# Altium footprint library 3M THD.PcbLib: 163 footprints (part 14 of 14)
Each footprint in its own frame and in the unit in brackets; x right, y up, seen from the top. Pads: shape width x height; smd on the part's side, far side on the other; paste and mask are expansions set on the pad; w line width, h text height; cw(c..) or ccw(c..) is an arc to the next point about the centre after c.
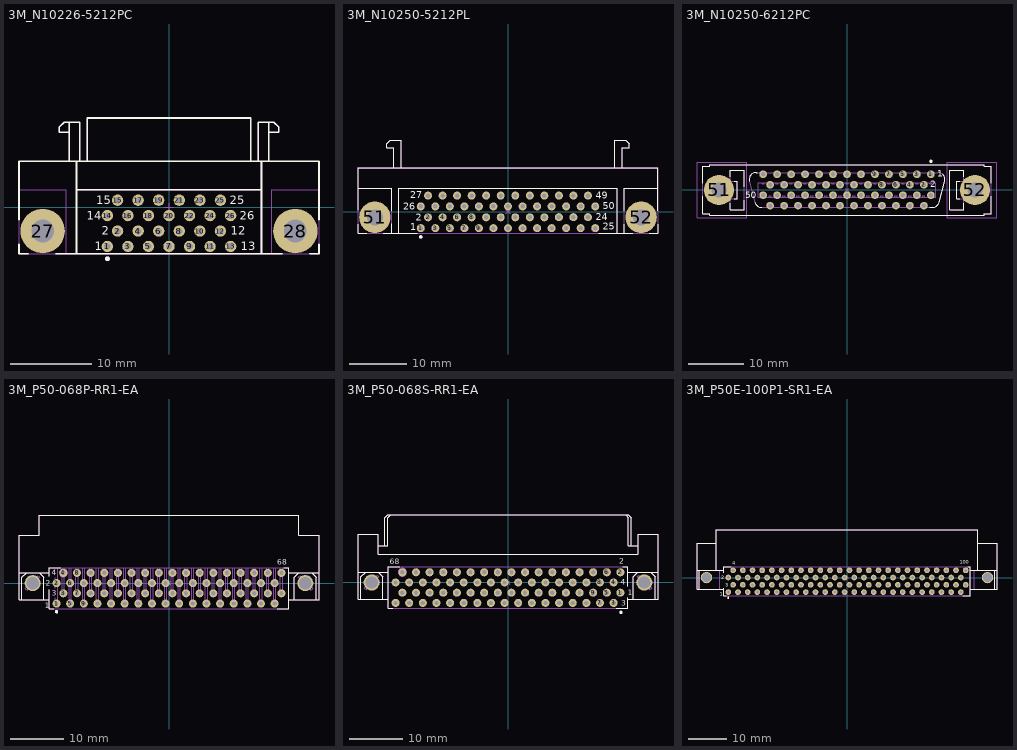
[diagram p13: the footprints below, top view; thin cyan lines are the x and y axes]

## 3M_N10226-5212PC [mm] "26 contacts, Mini D Ribbon (MDR), 102 Series, .050\" Boardmount Through-hole Right Angle Receptacle-Shielded"
height 9.4
pads (28):
  round 1.4 hole 0.8: 1(-7.62,-4.826) 2(-6.35,-2.921) 3(-5.08,-4.826) 4(-3.81,-2.921) 5(-2.54,-4.826) 6(-1.27,-2.921) 7(0,-4.826) 8(1.27,-2.921) 9(2.54,-4.826) 10(3.81,-2.921) 11(5.08,-4.826) 12(6.35,-2.921) 13(7.62,-4.826) 14(-7.62,-1.016) 15(-6.35,0.889) 16(-5.08,-1.016) 17(-3.81,0.889) 18(-2.54,-1.016) 19(-1.27,0.889) 20(0,-1.016) 21(1.27,0.889) 22(2.54,-1.016) 23(3.81,0.889) 24(5.08,-1.016) 25(6.35,0.889) 26(7.62,-1.016)
  round 5.5 hole 2.8: 27(-15.621,-2.921) 28(15.621,-2.921)
Top Overlay:
  circle w0.3: c-7.62,-6.35 r0.15
  lines w0.2: -18.542,-4.578 -18.542,-5.715 -17.405,-5.715 ; -18.542,-1.5 -18.542,5.715 18.542,5.715 18.542,-1.5 ; -14,-5.715 14,-5.715 ; -12.319,5.715 -12.319,10.541 ; -12.319,9.271 -13.589,9.271 -13.589,9.906 -12.954,10.541 -12.319,10.541 ; -11.43,-5.715 -11.43,5.715 ; -11.43,2.159 11.43,2.159 ; -11.049,5.715 -11.049,10.541 -12.319,10.541 ; -10.1,5.715 -10.1,11.049 10.1,11.049 10.1,5.715 ; 11.049,5.715 11.049,10.541 12.319,10.541 ; 11.43,-5.715 11.43,5.715 ; 12.319,5.715 12.319,10.541 ; 12.319,9.271 13.589,9.271 13.589,9.906 12.954,10.541 12.319,10.541 ; 17.405,-5.715 18.542,-5.715 18.542,-4.578
  text "1" at -9.19,-5.31 h1.02
  text "2" at -8.32,-3.405 h1.02
  text "15" at -9.02,0.405 h1.02
  text "14" at -10.14,-1.5 h1.02
  text "26" at 8.77,-1.505 h1.02
  text "13" at 8.895,-5.315 h1.02
  text "12" at 7.615,-3.41 h1.02
  text "25" at 7.49,0.4 h1.02
Mechanical 8:
  lines w0.1: -8.12,-4.826 -7.62,-4.826 ; -8.12,-1.016 -7.62,-1.016 ; -7.62,-5.326 -7.62,-4.826 ; -7.62,-4.326 -7.62,-4.826 ; -7.12,-4.826 -7.62,-4.826 ; -7.12,-1.016 -7.62,-1.016 ; -6.85,-2.921 -6.35,-2.921 ; -6.85,0.889 -6.35,0.889 ; -6.35,-3.421 -6.35,-2.921 ; -6.35,-2.421 -6.35,-2.921 ; -6.35,0.389 -6.35,0.889 ; -6.35,1.389 -6.35,0.889 ; -5.85,-2.921 -6.35,-2.921 ; -5.85,0.889 -6.35,0.889 ; -5.58,-4.826 -5.08,-4.826 ; -5.58,-1.016 -5.08,-1.016 ; -5.08,-5.326 -5.08,-4.826 ; -5.08,-4.326 -5.08,-4.826 ; -4.58,-4.826 -5.08,-4.826 ; -4.58,-1.016 -5.08,-1.016 ; -4.31,-2.921 -3.81,-2.921 ; -4.31,0.889 -3.81,0.889 ; -3.81,-3.421 -3.81,-2.921 ; -3.81,-2.421 -3.81,-2.921 ; -3.81,0.389 -3.81,0.889 ; -3.81,1.389 -3.81,0.889 ; -3.31,-2.921 -3.81,-2.921 ; -3.31,0.889 -3.81,0.889 ; -3.04,-4.826 -2.54,-4.826 ; -3.04,-1.016 -2.54,-1.016 ; -2.54,-5.326 -2.54,-4.826 ; -2.54,-4.326 -2.54,-4.826 ; -2.04,-4.826 -2.54,-4.826 ; -2.04,-1.016 -2.54,-1.016 ; -1.77,-2.921 -1.27,-2.921 ; -1.77,0.889 -1.27,0.889 ; -1.27,-3.421 -1.27,-2.921 ; -1.27,-2.421 -1.27,-2.921 ; -1.27,0.389 -1.27,0.889 ; -1.27,1.389 -1.27,0.889 ; -0.77,-2.921 -1.27,-2.921 ; -0.77,0.889 -1.27,0.889 ; -0.5,-4.826 0,-4.826 ; -0.5,-1.016 0,-1.016 ; -0.5,0 0,0 ; 0,-5.326 0,-4.826 ; 0,-4.326 0,-4.826 ; 0.5,-4.826 0,-4.826 ; 0.5,-1.016 0,-1.016 ; 0.5,0 0,0 ; 0.77,-2.921 1.27,-2.921 ; 0.77,0.889 1.27,0.889 ; 1.27,-3.421 1.27,-2.921 ; 1.27,-2.421 1.27,-2.921 ; 1.27,0.389 1.27,0.889 ; 1.27,1.389 1.27,0.889 ; 1.77,-2.921 1.27,-2.921 ; 1.77,0.889 1.27,0.889 ; 2.04,-4.826 2.54,-4.826 ; 2.04,-1.016 2.54,-1.016 ; 2.54,-5.326 2.54,-4.826 ; 2.54,-4.326 2.54,-4.826 ; 3.04,-4.826 2.54,-4.826 ; 3.04,-1.016 2.54,-1.016 ; 3.31,-2.921 3.81,-2.921 ; 3.31,0.889 3.81,0.889 ; 3.81,-3.421 3.81,-2.921 ; 3.81,-2.421 3.81,-2.921 ; 3.81,0.389 3.81,0.889 ; 3.81,1.389 3.81,0.889 ; 4.31,-2.921 3.81,-2.921 ; 4.31,0.889 3.81,0.889 ; 4.58,-4.826 5.08,-4.826 ; 4.58,-1.016 5.08,-1.016 ; 5.08,-5.326 5.08,-4.826 ; 5.08,-4.326 5.08,-4.826 ; 5.58,-4.826 5.08,-4.826 ; 5.58,-1.016 5.08,-1.016 ; 5.85,-2.921 6.35,-2.921 ; 5.85,0.889 6.35,0.889 ; 6.35,-3.421 6.35,-2.921 ; 6.35,-2.421 6.35,-2.921 ; 6.35,0.389 6.35,0.889 ; 6.35,1.389 6.35,0.889 ; 6.85,-2.921 6.35,-2.921 ; 6.85,0.889 6.35,0.889 ; 7.12,-4.826 7.62,-4.826 ; 7.12,-1.016 7.62,-1.016 ; 7.62,-5.326 7.62,-4.826 ; 7.62,-4.326 7.62,-4.826 ; 8.12,-4.826 7.62,-4.826 ; 8.12,-1.016 7.62,-1.016 ; 15.121,-2.921 15.621,-2.921 ; 15.621,-3.421 15.621,-2.921 ; 15.621,-2.421 15.621,-2.921 ; 16.121,-2.921 15.621,-2.921 ; -7.62,-1.016 -7.62,-1.516 -7.62,-1.016 ; -7.62,-1.016 -7.62,-0.516 -7.62,-1.016 ; -5.08,-1.016 -5.08,-1.516 -5.08,-1.016 ; -5.08,-1.016 -5.08,-0.516 -5.08,-1.016 ; -2.54,-1.016 -2.54,-1.516 -2.54,-1.016 ; -2.54,-1.016 -2.54,-0.516 -2.54,-1.016 ; 0,-1.016 0,-1.516 0,-1.016 ; 0,-1.016 0,-0.516 0,-1.016 ; 0,0 0,-0.5 0,0 ; 0,0 0,0.5 0,0 ; 2.54,-1.016 2.54,-1.516 2.54,-1.016 ; 2.54,-1.016 2.54,-0.516 2.54,-1.016 ; 5.08,-1.016 5.08,-1.516 5.08,-1.016 ; 5.08,-1.016 5.08,-0.516 5.08,-1.016 ; 7.62,-1.016 7.62,-1.516 7.62,-1.016 ; 7.62,-1.016 7.62,-0.516 7.62,-1.016
  lines w0.2: -16.121,-2.921 -15.621,-2.921 ; -15.621,-3.421 -15.621,-2.921 ; -15.621,-2.421 -15.621,-2.921 ; -15.121,-2.921 -15.621,-2.921
Mechanical 14:
  circle w0.1: c-15.621,-2.921 r1.245
  circle w0.1: c15.621,-2.921 r1.245
  circle w0.1: c15.621,-2.921 r1.245
  circle w0.3: c-7.62,-6.35 r0.15
  lines w0.1: -18.542,2.159 -12.7,2.159 -12.7,-5.715 ; -15.875,-4.139 -15.875,-5.099 -15.367,-5.099 -15.367,-4.139 ; -15.875,-1.703 -15.875,-0.743 -15.367,-0.743 -15.367,-1.703 ; -12.319,5.715 -12.319,10.541 ; -12.319,9.271 -13.589,9.271 -13.589,9.906 -12.954,10.541 -12.319,10.541 ; -11.43,-5.715 -11.43,5.715 ; -11.43,2.159 11.43,2.159 ; -11.049,5.715 -11.049,10.541 -12.319,10.541 ; -10.1,5.715 -10.1,11.049 10.1,11.049 10.1,5.715 ; 11.049,5.715 11.049,10.541 12.319,10.541 ; 11.43,-5.715 11.43,5.715 ; 12.319,5.715 12.319,10.541 ; 12.319,9.271 13.589,9.271 13.589,9.906 12.954,10.541 12.319,10.541 ; 12.7,-5.715 12.7,2.159 18.542,2.159 ; 15.367,-4.139 15.367,-5.099 15.875,-5.099 15.875,-4.139 ; 15.367,-1.703 15.367,-0.743 15.875,-0.743 15.875,-1.703 ; -18.542,-5.715 18.542,-5.715 18.542,5.715 -18.542,5.715 -18.542,-5.715
  text "1" at -9.19,-5.31 h1.02
  text "2" at -8.32,-3.405 h1.02
  text "15" at -9.02,0.405 h1.02
  text "14" at -10.14,-1.5 h1.02
  text "26" at 8.77,-1.505 h1.02
  text "13" at 8.895,-5.315 h1.02
  text "12" at 7.615,-3.41 h1.02
  text "25" at 7.49,0.4 h1.02
3D body "3M_N10226-5212PC.stp": height 9.4, standoff -3.81, extent -18.542,-5.715 18.542,11.049

## 3M_N10250-5212PL [mm] "50 contacts, Mini D Ribbon (MDR), 102 Series, .050\" Boardmount Through-hole Right Angle Receptacle-Shielded"
height 9.4
pads (52):
  round 1.4 hole 0.8: 1(-15.24,-2.85) 2(-13.97,-0.945) 3(-12.7,-2.85) 4(-11.43,-0.945) 5(-10.16,-2.85) 6(-8.89,-0.945) 7(-7.62,-2.85) 8(-6.35,-0.945) 9(-5.08,-2.85) 10(-3.81,-0.945) 11(-2.54,-2.85) 12(-1.27,-0.945) 13(0,-2.85) 14(1.27,-0.945) 15(2.54,-2.85) 16(3.81,-0.945) 17(5.08,-2.85) 18(6.35,-0.945) 19(7.62,-2.85) 20(8.89,-0.936) 21(10.16,-2.85) 22(11.43,-0.936) 23(12.7,-2.85) 24(13.97,-0.936) 25(15.24,-2.85) 26(-15.24,0.95) 27(-13.97,2.85) 28(-12.7,0.95) 29(-11.43,2.85) 30(-10.16,0.95) 31(-8.89,2.85) 32(-7.62,0.95) 33(-6.35,2.85) 34(-5.08,0.95) 35(-3.81,2.85) 36(-2.54,0.95) 37(-1.27,2.85) 38(0,0.95) 39(1.27,2.85) 40(2.54,0.95) 41(3.81,2.85) 42(5.08,0.95) 43(6.35,2.85) 44(7.62,0.95) 45(8.89,2.85) 46(10.16,0.95) 47(11.43,2.85) 48(12.7,0.95) 49(13.97,2.85) 50(15.24,0.95)
  round 5.5 hole 2.8: 51(-23.25,-0.95) 52(23.25,-0.95)
Top Overlay:
  circle w0.3: c-15.24,-4.374 r0.15
  lines w0.2: -26.162,-2.173 -26.162,-3.744 -24.714,-3.744 ; -26.162,0.273 -26.162,7.686 26.162,7.686 26.162,0.229 ; -26.162,4.13 -20.32,4.13 -20.32,0.183 ; -21.804,-3.744 -15.881,-3.744 ; -20.32,-3.744 -20.32,-2.083 ; -19.939,7.65 -19.939,11.242 -21.209,11.242 -21.209,11.877 -20.574,12.512 -18.669,12.512 -18.669,7.686 ; -19.05,-3.744 -19.05,4.13 19.05,4.13 19.05,-3.744 ; 15.881,-3.744 21.786,-3.744 ; 18.669,7.686 18.669,12.512 20.574,12.512 21.209,11.877 21.209,11.242 19.939,11.242 19.939,7.686 ; 20.32,-3.744 20.32,-2.129 ; 20.32,0.229 20.32,4.13 26.162,4.13 ; 24.696,-3.744 26.162,-3.744 26.162,-2.129
  text "1" at -17.06,-3.184 h1.2
  text "2" at -16.115,-1.529 h1.2
  text "27" at -17.115,2.381 h1.2
  text "26" at -18.285,0.401 h1.2
  text "50" at 16.565,0.446 h1.2
  text "25" at 16.59,-3.139 h1.2
  text "24" at 15.31,-1.434 h1.2
  text "49" at 15.36,2.276 h1.2
Mechanical 8:
  drawing of 216 lines, arcs and shapes, not listed
Mechanical 14:
  circle w0.3: c-15.24,-4.374 r0.15
  lines w0.1: -26.162,4.13 -20.32,4.13 -20.32,-3.744 ; -19.939,7.65 -19.939,11.242 -21.209,11.242 -21.209,11.877 -20.574,12.512 -18.669,12.512 -18.669,7.686 ; -19.05,-3.744 -19.05,4.13 19.05,4.13 19.05,-3.744 ; 18.669,7.686 18.669,12.512 20.574,12.512 21.209,11.877 21.209,11.242 19.939,11.242 19.939,7.686 ; 20.32,-3.744 20.32,4.13 26.162,4.13 ; -26.162,-3.744 26.162,-3.744 26.162,7.686 -26.162,7.686 -26.162,-3.744 ; -23.495,-3.439 -23.495,-2.35 cw(c-23.241,-0.95) -23.495,0.45 -23.495,1.539 -22.987,1.539 -22.987,0.45 cw(c-23.241,-0.95) -22.987,-2.35 -22.987,-3.439 -23.495,-3.439 ; 22.987,-3.439 23.495,-3.439 23.495,-2.35 ccw(c23.241,-0.95) 23.495,0.45 23.495,1.539 22.987,1.539 22.987,0.45 ccw(c23.241,-0.95) 22.987,-2.35 22.987,-3.439
  text "1" at -17.06,-3.184 h1.2
  text "2" at -16.115,-1.529 h1.2
  text "27" at -17.115,2.381 h1.2
  text "26" at -18.285,0.401 h1.2
  text "50" at 16.565,0.446 h1.2
  text "25" at 16.59,-3.139 h1.2
  text "24" at 15.31,-1.434 h1.2
  text "49" at 15.36,2.276 h1.2
3D body "3M_N10250-5212PL.stp": height 9.4, standoff -3.81, extent -26.162,-3.744 26.162,13.02

## 3M_N10250-6212PC [mm] "50 contacts, Mini D Ribbon (MDR), .050\" Boardmount Through-hole Vertical Receptacle - Shielded"
height 11
pads (52):
  round 1.4 hole 0.8: 1(15.24,2.86) 2(13.97,0.955) 3(12.7,2.86) 4(11.43,0.955) 5(10.16,2.86) 6(8.89,0.955) 7(7.62,2.86) 8(6.35,0.955) 9(5.08,2.86) 10(3.81,0.955) 11(2.54,2.86) 12(1.27,0.955) 13(0,2.86) 14(-1.27,0.955) 15(-2.54,2.86) 16(-3.81,0.955) 17(-5.08,2.86) 18(-6.35,0.955) 19(-7.62,2.86) 20(-8.89,0.946) 21(-10.16,2.86) 22(-11.43,0.946) 23(-12.7,2.86) 24(-13.97,0.946) 25(-15.24,2.86) 26(15.24,-0.94) 27(13.97,-2.84) 28(12.7,-0.94) 29(11.43,-2.84) 30(10.16,-0.94) 31(8.89,-2.84) 32(7.62,-0.94) 33(6.35,-2.84) 34(5.08,-0.94) 35(3.81,-2.84) 36(2.54,-0.94) 37(1.27,-2.84) 38(0,-0.94) 39(-1.27,-2.84) 40(-2.54,-0.94) 41(-3.81,-2.84) 42(-5.08,-0.94) 43(-6.35,-2.84) 44(-7.62,-0.94) 45(-8.89,-2.84) 46(-10.16,-0.94) 47(-11.43,-2.84) 48(-12.7,-0.94) 49(-13.97,-2.84) 50(-15.24,-0.94)
  round 5.5 hole 2.8: 51(-23.25,0) 52(23.25,0)
Top Overlay:
  circle w0.3: c15.24,5.209 r0.15
  lines w0.2: -26.162,-1.179 -26.162,-4.318 -24.892,-4.318 -24.892,-4.572 24.892,-4.572 24.892,-4.318 26.162,-4.318 26.162,-1.179 ; -26.162,1.179 -26.162,4.318 -24.892,4.318 -24.892,4.572 24.892,4.572 24.892,4.318 26.162,4.318 26.162,1.179 ; -21.209,-2.407 -21.209,-3.556 -18.669,-3.556 -18.669,-1.881 ; -21.209,2.407 -21.209,3.556 -18.669,3.556 -18.669,0.6 ; -20.52,-1.587 -19.939,-1.587 -19.939,1.587 -20.52,1.587 ; -17.737,1.576 cw(c-16.51,1.905) -16.51,3.175 -16.294,3.175 ; -16.716,-2.234 ccw(c-15.489,-1.905) -15.489,-3.175 ; 15.022,-3.175 15.489,-3.175 ccw(c15.489,-1.905) 16.716,-2.234 17.737,1.576 ccw(c16.51,1.905) 17.326,2.878 ; 20.52,-1.587 19.939,-1.587 19.939,1.587 20.52,1.587 ; 21.209,-2.407 21.209,-3.556 18.669,-3.556 18.669,3.556 21.209,3.556 21.209,2.407
  text "50" at -18.525,-1.525 h1.2
  text "2" at 15.121,0.455 h1.2
  text "1" at 16.391,2.36 h1.2
Mechanical 8:
  drawing of 222 lines, arcs and shapes, not listed
Mechanical 14:
  drawing of 192 lines, arcs and shapes, not listed
3D body "3M_N10250-6212PC.stp": height 11.18, standoff -3.4, extent -26.162,-4.572 26.162,4.572

## 3M_P50-068P-RR1-EA [mm] "68 Contacts, 050\", Right Angle, Pak 50 Boardmount Plug With Retention Clips, P50 Series"
height 7
pads (70):
  round 1.5 hole 0.8: 1(-20.955,-3.81) 2(-20.955,0) 3(-19.685,-1.905) 4(-19.685,1.905) 5(-18.415,-3.81) 6(-18.415,0) 7(-17.145,-1.905) 8(-17.145,1.905) 9(-15.875,-3.81) 10(-15.875,0) 11(-14.605,-1.905) 12(-14.605,1.905) 13(-13.335,-3.81) 14(-13.335,0) 15(-12.065,-1.905) 16(-12.065,1.905) 17(-10.795,-3.81) 18(-10.795,0) 19(-9.525,-1.905) 20(-9.525,1.905) 21(-8.255,-3.81) 22(-8.255,0) 23(-6.985,-1.905) 24(-6.985,1.905) 25(-5.715,-3.81) 26(-5.715,0) 27(-4.445,-1.905) 28(-4.445,1.905) 29(-3.175,-3.81) 30(-3.175,0) 31(-1.905,-1.905) 32(-1.905,1.905) 33(-0.635,-3.81) 34(-0.635,0) 35(0.635,-1.905) 36(0.635,1.905) 37(1.905,-3.81) 38(1.905,0) 39(3.175,-1.905) 40(3.175,1.905) 41(4.445,-3.81) 42(4.445,0) 43(5.715,-1.905) 44(5.715,1.905) 45(6.985,-3.81) 46(6.985,0) 47(8.255,-1.905) 48(8.255,1.905) 49(9.525,-3.81) 50(9.525,0) 51(10.795,-1.905) 52(10.795,1.905) 53(12.065,-3.81) 54(12.065,0) 55(13.335,-1.905) 56(13.335,1.905) 57(14.605,-3.81) 58(14.605,0) 59(15.875,-1.905) 60(15.875,1.905) 61(17.145,-3.81) 62(17.145,0) 63(18.415,-1.905) 64(18.415,1.905) 65(19.685,-3.81) 66(19.685,0) 67(20.955,-1.905) 68(20.955,1.905)
  round 3 hole 2.3: MECH(-25.4,0) MECH(25.4,0)
Top Overlay:
  circle w0.3: c-20.955,-5.334 r0.15
  lines w0.2: -27.955,1.905 -22.355,1.905 ; -27.45,-3.095 -27.45,1.061 -26.55,1.905 ; -24.17,1.905 -23.35,1.061 -23.35,-3.095 ; -22.355,-3.095 -27.955,-3.095 -27.955,8.955 -24.155,8.955 -24.155,12.605 24.155,12.605 24.155,8.955 27.955,8.955 27.955,-3.095 22.355,-3.095 ; -22.355,-1.25 -22.355,-4.795 -21.445,-4.795 ; -22.355,1.25 -22.355,2.905 -20.143,2.905 ; 20.175,-4.795 22.355,-4.795 22.355,2.905 21.413,2.905 ; 22.355,1.905 27.955,1.905 ; 23.35,-3.095 23.35,1.061 24.17,1.905 ; 26.606,1.905 27.45,1.061 27.45,-3.095
  text "68" at 20.184,3.449 h1
  text "1" at -23.185,-4.725 h1
  text "2" at -22.937,-0.484 h1
  text "4" at -21.809,1.421 h1
  text "3" at -21.809,-2.389 h1
Mechanical 8:
  drawing of 285 lines, arcs and shapes, not listed
Mechanical 14:
  circle w0.3: c-20.955,-5.334 r0.15
  lines w0.1: -27.955,1.905 -22.355,1.905 ; -27.45,-3.095 -27.45,1.061 -26.55,1.905 ; -26.341,-0.661 cw(c-25.4,0) -24.734,0.937 ; -26.061,-0.941 ccw(c-25.4,0) -24.463,0.666 ; -24.17,1.905 -23.35,1.061 -23.35,-3.095 ; -22.355,-3.095 -27.955,-3.095 -27.955,8.955 -24.155,8.955 -24.155,12.605 24.155,12.605 24.155,8.955 27.955,8.955 27.955,-3.095 22.355,-3.095 ; -22.355,-1.25 -22.355,-4.795 22.355,-4.795 22.355,2.905 -22.355,2.905 -22.355,1.25 ; -21.155,-2.75 -21.155,-4.01 -20.755,-4.01 -20.755,2.905 ; -21.155,-1 -21.155,1 ; -19.885,2.905 -19.885,-2.105 -19.485,-2.105 -19.485,2.905 ; -18.615,2.905 -18.615,-4.01 -18.215,-4.01 -18.215,2.905 ; -17.345,2.905 -17.345,-2.105 -16.945,-2.105 -16.945,2.905 ; -16.075,2.905 -16.075,-4.01 -15.675,-4.01 -15.675,2.905 ; -14.805,2.905 -14.805,-2.105 -14.405,-2.105 -14.405,2.905 ; -13.535,2.905 -13.535,-4.01 -13.135,-4.01 -13.135,2.905 ; -12.265,2.905 -12.265,-2.105 -11.865,-2.105 -11.865,2.905 ; -10.995,2.905 -10.995,-4.01 -10.595,-4.01 -10.595,2.905 ; -9.725,2.905 -9.725,-2.105 -9.325,-2.105 -9.325,2.905 ; -8.455,2.905 -8.455,-4.01 -8.055,-4.01 -8.055,2.905 ; -7.185,2.905 -7.185,-2.105 -6.785,-2.105 -6.785,2.905 ; -5.915,2.905 -5.915,-4.01 -5.515,-4.01 -5.515,2.905 ; -4.645,2.905 -4.645,-2.105 -4.245,-2.105 -4.245,2.905 ; -3.375,2.905 -3.375,-4.01 -2.975,-4.01 -2.975,2.905 ; -2.105,2.905 -2.105,-2.105 -1.705,-2.105 -1.705,2.905 ; -0.835,2.905 -0.835,-4.01 -0.435,-4.01 -0.435,2.905 ; 0.435,2.905 0.435,-2.105 0.835,-2.105 0.835,2.905 ; 1.705,2.905 1.705,-4.01 2.105,-4.01 2.105,2.905 ; 2.975,2.905 2.975,-2.105 3.375,-2.105 3.375,2.905 ; 4.245,2.905 4.245,-4.01 4.645,-4.01 4.645,2.905 ; 5.515,2.905 5.515,-2.105 5.915,-2.105 5.915,2.905 ; 6.785,2.905 6.785,-4.01 7.185,-4.01 7.185,2.905 ; 8.055,2.905 8.055,-2.105 8.455,-2.105 8.455,2.905 ; 9.325,2.905 9.325,-4.01 9.725,-4.01 9.725,2.905 ; 10.595,2.905 10.595,-2.105 10.995,-2.105 10.995,2.905 ; 11.865,2.905 11.865,-4.01 12.265,-4.01 12.265,2.905 ; 13.135,2.905 13.135,-2.105 13.535,-2.105 13.535,2.905 ; 14.405,2.905 14.405,-4.01 14.805,-4.01 14.805,2.905 ; 15.675,2.905 15.675,-2.105 16.075,-2.105 16.075,2.905 ; 16.945,2.905 16.945,-4.01 17.345,-4.01 17.345,2.905 ; 18.215,2.905 18.215,-2.105 18.615,-2.105 18.615,2.905 ; 19.485,2.905 19.485,-4.01 19.885,-4.01 19.885,2.905 ; 20.755,2.905 20.755,-2.105 21.155,-2.105 21.155,2.905 ; 22.355,1.905 27.955,1.905 ; 23.35,-3.095 23.35,1.061 24.17,1.905 ; 24.458,0.659 ccw(c25.4,0) 26.059,-0.942 ; 24.741,0.942 cw(c25.4,0) 26.342,-0.659 ; 26.606,1.905 27.45,1.061 27.45,-3.095 ; -26.744,-1.061 -24.332,1.336 -24.064,1.068 -26.461,-1.344 -26.744,-1.061 ; 24.056,1.061 26.461,-1.344 26.744,-1.061 24.339,1.344 24.056,1.061
  text "68" at 20.184,3.449 h1
  text "1" at -23.185,-4.725 h1
  text "2" at -22.937,-0.484 h1
  text "4" at -21.809,1.421 h1
  text "3" at -21.809,-2.389 h1
3D body "3M_P50-068P-RR1-EA.stp": height 7, standoff -3, extent -27.955,-4.795 27.955,12.605

## 3M_P50-068S-RR1-EA [mm] "68 Contacts, 050\", Right Angle, Pak 50 Boardmount Socket With Retention Clips, P50 Series"
height 7
pads (70):
  round 1.5 hole 0.8: 1(20.955,-1.905) 2(20.955,1.905) 3(19.685,-3.81) 4(19.685,0) 5(18.415,-1.905) 6(18.415,1.905) 7(17.145,-3.81) 8(17.145,0) 9(15.875,-1.905) 10(15.875,1.905) 11(14.605,-3.81) 12(14.605,0) 13(13.335,-1.905) 14(13.335,1.905) 15(12.065,-3.81) 16(12.065,0) 17(10.795,-1.905) 18(10.795,1.905) 19(9.525,-3.81) 20(9.525,0) 21(8.255,-1.905) 22(8.255,1.905) 23(6.985,-3.81) 24(6.985,0) 25(5.715,-1.905) 26(5.715,1.905) 27(4.445,-3.81) 28(4.445,0) 29(3.175,-1.905) 30(3.175,1.905) 31(1.905,-3.81) 32(1.905,0) 33(0.635,-1.905) 34(0.635,1.905) 35(-0.635,-3.81) 36(-0.635,0) 37(-1.905,-1.905) 38(-1.905,1.905) 39(-3.175,-3.81) 40(-3.175,0) 41(-4.445,-1.905) 42(-4.445,1.905) 43(-5.715,-3.81) 44(-5.715,0) 45(-6.985,-1.905) 46(-6.985,1.905) 47(-8.255,-3.81) 48(-8.255,0) 49(-9.525,-1.905) 50(-9.525,1.905) 51(-10.795,-3.81) 52(-10.795,0) 53(-12.065,-1.905) 54(-12.065,1.905) 55(-13.335,-3.81) 56(-13.335,0) 57(-14.605,-1.905) 58(-14.605,1.905) 59(-15.875,-3.81) 60(-15.875,0) 61(-17.145,-1.905) 62(-17.145,1.905) 63(-18.415,-3.81) 64(-18.415,0) 65(-19.685,-1.905) 66(-19.685,1.905) 67(-20.955,-3.81) 68(-20.955,0)
  round 3 hole 2.3: MECH(-25.4,0) MECH(25.4,0)
Top Overlay:
  circle w0.3: c21.05,-5.564 r0.15
  lines w0.2: -27.955,1.905 -22.355,1.905 ; -27.45,-3.095 -27.45,1.061 -26.55,1.905 ; -24.194,1.905 -23.35,1.061 -23.35,-3.095 ; -24.155,6.805 -22.455,6.805 -22.455,12.105 -21.88,12.605 ; -22.955,6.805 -22.955,12.105 -22.455,12.605 22.455,12.605 22.955,12.105 22.955,6.805 ; -22.355,-3.095 -27.955,-3.095 -27.955,8.955 -24.155,8.955 -24.155,5.305 24.155,5.305 ; -21.445,-4.795 -22.34,-4.795 -22.34,2.905 -20.143,2.905 ; 20.175,-4.795 22.355,-4.795 22.355,-2.89 ; 21.413,2.905 22.355,2.905 22.355,-0.74 ; 21.955,12.605 22.455,12.105 22.455,6.805 24.155,6.805 ; 22.355,-3.095 27.955,-3.095 27.955,8.955 24.155,8.955 24.17,5.305 ; 22.355,1.905 27.955,1.905 ; 23.35,-3.095 23.35,1.061 24.17,1.905 ; 26.63,1.905 27.45,1.061 27.45,-3.095
  text "68" at -22.075,3.375 h1
  text "2" at 20.725,3.515 h1
  text "4" at 21.055,-0.46 h1
  text "3" at 21.075,-4.3 h1
  text "1" at 22.3,-2.35 h1
Mechanical 8:
  drawing of 285 lines, arcs and shapes, not listed
Mechanical 14:
  circle w0.1: c-25.4,0 r1.15
  circle w0.1: c25.4,0 r1.15
  circle w0.3: c21.05,-5.564 r0.15
  lines w0.1: -27.955,1.905 -22.355,1.905 ; -27.45,-3.095 -27.45,1.061 -26.55,1.905 ; -24.194,1.905 -23.35,1.061 -23.35,-3.095 ; -24.155,6.805 -22.455,6.805 -22.455,12.105 -21.88,12.605 ; -22.955,6.805 -22.955,12.105 -22.455,12.605 22.455,12.605 22.955,12.105 22.955,6.805 ; -22.355,-3.095 -27.955,-3.095 -27.955,8.955 -24.155,8.955 -24.155,5.305 24.155,5.305 ; 21.955,12.605 22.455,12.105 22.455,6.805 24.155,6.805 ; 22.355,-3.095 27.955,-3.095 27.955,8.955 24.155,8.955 24.17,5.305 ; 22.355,-2.89 22.355,-4.795 -22.34,-4.795 -22.34,2.905 22.355,2.905 22.355,-0.74 ; 22.355,1.905 27.955,1.905 ; 23.35,-3.095 23.35,1.061 24.17,1.905 ; 26.63,1.905 27.45,1.061 27.45,-3.095 ; -26.744,-1.061 -26.461,-1.344 -24.056,1.061 -24.332,1.336 -26.744,-1.061 ; 24.056,1.061 24.339,1.344 26.744,-1.061 26.461,-1.344 24.056,1.061
3D body "3M_P50-068S-RR1-EA.stp": height 7, standoff -3, extent -27.955,-4.795 27.955,12.605

## 3M_P50E-100P1-SR1-EA [mm] "100 Contacts - .050\" Right Angle, Pak 50 Boardmount Plug, P50E Series"
height 7
pads (102):
  round 1.5 hole 0.8: 1(-31.115,-3.81) 2(-31.115,0) 3(-29.845,-1.905) 4(-29.845,1.905) 5(-28.575,-3.81) 6(-28.575,0) 7(-27.305,-1.905) 8(-27.305,1.905) 9(-26.035,-3.81) 10(-26.035,0) 11(-24.765,-1.905) 12(-24.765,1.905) 13(-23.495,-3.81) 14(-23.495,0) 15(-22.225,-1.905) 16(-22.225,1.905) 17(-20.955,-3.81) 18(-20.955,0) 19(-19.685,-1.905) 20(-19.685,1.905) 21(-18.415,-3.81) 22(-18.415,0) 23(-17.145,-1.905) 24(-17.145,1.905) 25(-15.875,-3.81) 26(-15.875,0) 27(-14.605,-1.905) 28(-14.605,1.905) 29(-13.335,-3.81) 30(-13.335,0) 31(-12.065,-1.905) 32(-12.065,1.905) 33(-10.795,-3.81) 34(-10.795,0) 35(-9.525,-1.905) 36(-9.525,1.905) 37(-8.255,-3.81) 38(-8.255,0) 39(-6.985,-1.905) 40(-6.985,1.905) 41(-5.715,-3.81) 42(-5.715,0) 43(-4.445,-1.905) 44(-4.445,1.905) 45(-3.175,-3.81) 46(-3.175,0) 47(-1.905,-1.905) 48(-1.905,1.905) 49(-0.635,-3.81) 50(-0.635,0) 51(0.635,-1.905) 52(0.635,1.905) 53(1.905,-3.81) 54(1.905,0) 55(3.175,-1.905) 56(3.175,1.905) 57(4.445,-3.81) 58(4.445,0) 59(5.715,-1.905) 60(5.715,1.905) 61(6.985,-3.81) 62(6.985,0) 63(8.255,-1.905) 64(8.255,1.905) 65(9.525,-3.81) 66(9.525,0) 67(10.795,-1.905) 68(10.795,1.905) 69(12.065,-3.81) 70(12.065,0) 71(13.335,-1.905) 72(13.335,1.905) 73(14.605,-3.81) 74(14.605,0) 75(15.875,-1.905) 76(15.875,1.905) 77(17.145,-3.81) 78(17.145,0) 79(18.415,-1.905) 80(18.415,1.905) 81(19.685,-3.81) 82(19.685,0) 83(20.955,-1.905) 84(20.955,1.905) 85(22.225,-3.81) 86(22.225,0) 87(23.495,-1.905) 88(23.495,1.905) 89(24.765,-3.81) 90(24.765,0) 91(26.035,-1.905) 92(26.035,1.905) 93(27.305,-3.81) 94(27.305,0) 95(28.575,-1.905) 96(28.575,1.905) 97(29.845,-3.81) 98(29.845,0) 99(31.115,-1.905) 100(31.115,1.905)
  round 3 hole 2.3: 101(-36.83,0) 102(36.83,0)
Top Overlay:
  circle w0.3: c-31.115,-5.334 r0.15
  lines w0.2: -39.319,1.906 -32.258,1.906 ; -38.71,-3.098 -38.71,1.906 ; -34.29,1.906 -34.29,12.6 34.29,12.6 34.29,1.906 ; -34.29,8.942 -39.319,8.942 -39.319,-3.098 -32.258,-3.098 ; -32.258,-2.775 -32.258,-4.799 -31.596,-4.799 ; -32.258,1.246 -32.258,2.901 ; -32.258,2.897 -30.321,2.897 ; 30.326,-4.799 32.258,-4.799 32.258,2.897 31.591,2.897 ; 32.258,-3.098 39.319,-3.098 39.319,8.942 34.29,8.942 ; 32.258,1.906 39.319,1.906 ; 38.71,-3.098 38.71,1.906
  text "100" at 29.595,3.56 h1
  text "3" at -31.969,-2.389 h1
  text "4" at -30.136,3.34 h1
  text "2" at -33.015,-0.488 h1
  text "1" at -33.299,-4.799 h1
Mechanical 8:
  drawing of 417 lines, arcs and shapes, not listed
Mechanical 14:
  circle w0.3: c-31.115,-5.334 r0.15
  circle w0.1: c36.83,0 r1.156
  circle w0.1: c-36.83,0 r1.156
  lines w0.1: -39.319,1.906 -32.258,1.906 ; -38.71,-3.098 -38.71,1.906 ; -34.29,1.906 -34.29,12.6 34.29,12.6 34.29,1.906 ; -34.29,8.942 -39.319,8.942 -39.319,-3.098 -32.258,-3.098 ; -33.299,-3.098 -33.299,1.906 ; -32.258,-2.775 -32.258,-4.799 32.258,-4.799 32.258,2.897 -32.258,2.897 ; -32.258,1.246 -32.258,2.901 ; 32.258,-3.098 39.319,-3.098 39.319,8.942 34.29,8.942 ; 32.258,1.906 39.319,1.906 ; 33.299,-3.098 33.299,1.906 ; 38.71,-3.098 38.71,1.906
  text "100" at 29.595,3.56 h1
  text "3" at -31.969,-2.389 h1
  text "4" at -30.136,3.34 h1
  text "2" at -33.015,-0.488 h1
  text "1" at -33.299,-4.799 h1
3D body "3M_P50E-100P1-SR1.stp": height 7.01, standoff -3, extent -39.319,-4.799 39.319,12.6